# Altium footprint library FootprintsOld.PcbLib: 93 footprints (part 3 of 6)
Each footprint in its own frame and in the unit in brackets; x right, y up, seen from the top. Pads: shape width x height; smd on the part's side, far side on the other; paste and mask are expansions set on the pad; w line width, h text height; cw(c..) or ccw(c..) is an arc to the next point about the centre after c.
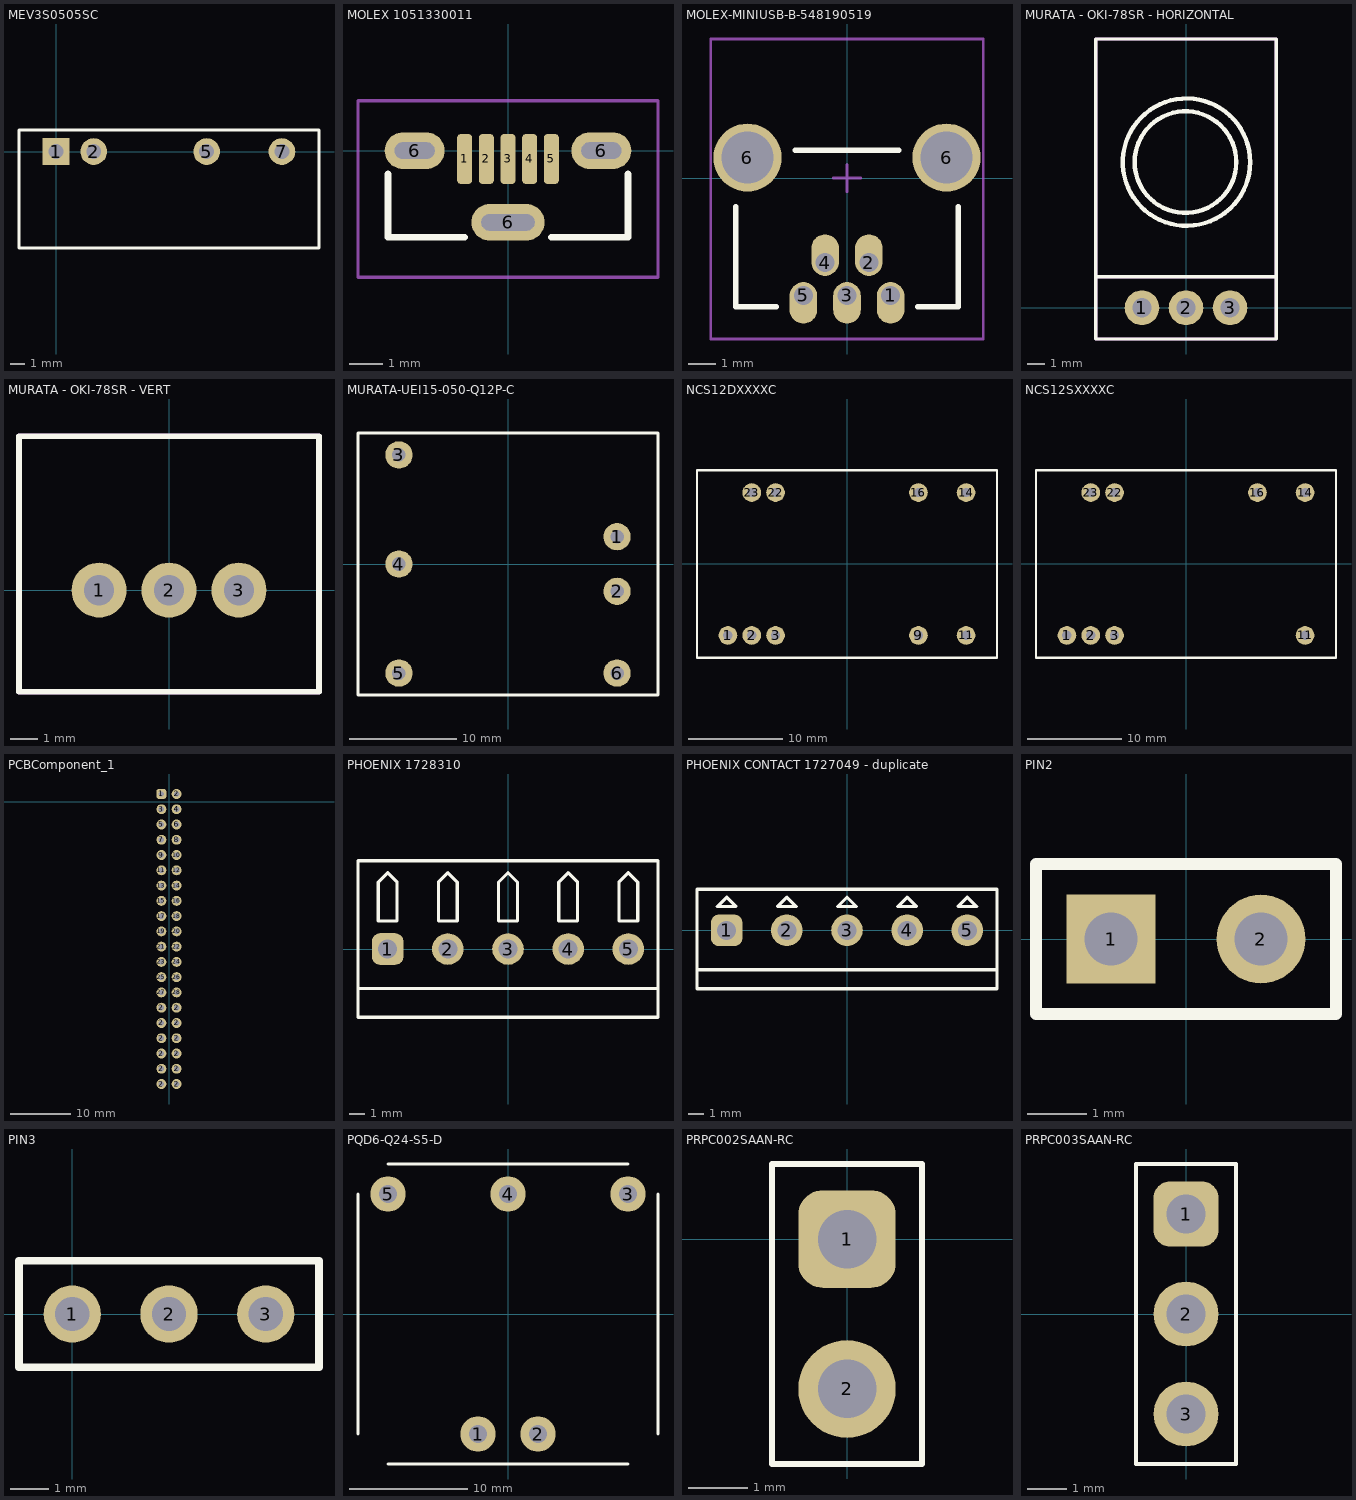
[diagram p2: the footprints below, top view; thin cyan lines are the x and y axes]

## MEV3S0505SC [mm]
pads (4):
  rect 1.8x1.8 hole 1: 1(0,0)
  round 1.8 hole 1: 2(2.54,0) 5(10.16,0) 7(15.24,0)
Top Overlay:
  lines w0.2: -2.5,-6.5 17.74,-6.5 17.74,1.45 -2.5,1.45 -2.5,-6.5
3D body "mps_dcdc_mev1s_48vin_sc_a.step": height 10.01, standoff -4.09, extent -2.105,-6.301 17.395,1.219

## MOLEX 1051330011 [mm] "Micro USB Type B Vertical"
pads (8):
  rrect50% 0.45x1.5 smd: 1(-1.3,-0.25) 2(-0.65,-0.25) 3(0,-0.25) 4(0.65,-0.25) 5(1.3,-0.25)
  oval 1.8x1.1 hole 0.5 slot 1.2 at 0 deg: 6(-2.8,0) 6(2.8,0)
  oval 2.2x1.1 hole 0.5 slot 1.6 at 0 deg: 6(0,-2.15)
Top Overlay:
  lines w0.2: -3.6,-0.7 -3.6,-2.6 -1.3,-2.6 ; 1.3,-2.6 3.6,-2.6 3.6,-0.7
Top Courtyard:
  lines w0.1: -4.5,-3.8 -4.5,1.5 4.5,1.5 4.5,-3.8 -4.5,-3.8
3D body "10513300111.STEP": height 7.52, standoff -2.28, extent -4.025,-3.325 4,1.125

## MOLEX-MINIUSB-B-548190519 [mm] "Conector Mini USB Type B Through Hole"
pads (7):
  oval 1.016x1.524 hole 0.7 copper offset 0,-0.275: 1(1.6,-4.3) 3(0,-4.3) 5(-1.6,-4.3)
  oval 1.016x1.524 hole 0.7 copper offset 0,0.275: 2(0.8,-3.1) 4(-0.8,-3.1)
  round 2.5 hole 1.9: 6(-3.65,0.75) 6(3.65,0.75)
Top Overlay:
  lines w0.2: -4.075,-1.05 -4.075,-4.725 -2.6,-4.725 ; -1.905,1.016 1.905,1.016 ; 2.6,-4.725 4.075,-4.725 4.075,-1.05
Top Courtyard:
  lines w0.1: -0.5,0 0.5,0 ; 0,-0.5 0,0.5 ; -5,-5.9 -5,5.1 5,5.1 5,-5.9 -5,-5.9
3D body "Conector-MOLEX-MINIUSB-B-548190519.STEP": height 3.95, standoff -1.8, extent -3.85,-4.5 3.85,4.5

## MURATA - OKI-78SR - HORIZONTAL [mm] "Non-Isolated DC-DC Converter"
height 9.3
pads (3):
  round 2 hole 1.1: 1(-2.54,0) 2(0,0) 3(2.54,0)
Top Overlay:
  circle w0.254: c-0.03,8.4 r2.93
  circle w0.254: c0.028,8.4 r3.672
  lines w0.2: -5.2,1.8 5.2,1.8 ; -5.2,-1.8 -5.2,15.5 5.2,15.5 5.2,-1.8 -5.2,-1.8
Mechanical 1:
  lines w0.2: -5.2,1.8 5.2,1.8 ; -5.2,-1.8 5.2,-1.8 5.2,15.5 -5.2,15.5 -5.2,-1.8
3D body: height 9.3, standoff 0, extent -5.2,-1.8 5.2,15.5

## MURATA - OKI-78SR - VERT [mm] "Non-Isolated DC-DC Converter"
height 9.3
pads (3):
  round 2 hole 1.1: 1(-2.54,0) 2(0,0) 3(2.54,0)
Top Overlay:
  lines w0.2: -5.45,-3.7 -5.45,5.6 5.45,5.6 5.45,-3.7 -5.45,-3.7
Mechanical 1:
  lines w0.2: -5.45,-3.7 -5.45,5.6 5.45,5.6 5.45,-3.7 -5.45,-3.7
3D body "mps_dcdc_oki_78sr_a.step": height 16.52, standoff -3.29, extent -5.107,-2.9 5.307,4.834

## MURATA-UEI15-050-Q12P-C [mm]
pads (6):
  round 2.54 hole 1.27: 1(10.16,2.54) 2(10.16,-2.54) 3(-10.16,10.16) 4(-10.16,0) 5(-10.16,-10.16) 6(10.16,-10.16)
Top Overlay:
  lines w0.254: -13.97,-12.192 13.97,-12.192 13.97,12.192 -13.97,12.192 -13.97,-12.192
3D body "MurataUei15.STEP": height 7.82, standoff -6.35, extent -13.97,-12.192 13.97,12.192

## NCS12DXXXXC [mm]
pads (9):
  round 2 hole 1: 1(-12.7,-7.62) 2(-10.16,-7.62) 3(-7.62,-7.62) 9(7.62,-7.62) 11(12.7,-7.62) 14(12.7,7.62) 16(7.62,7.62) 22(-7.62,7.62) 23(-10.16,7.62)
Top Overlay:
  lines w0.254: -16,-10 16,-10 16,10 -16,10 -16,-10
3D body "PowerDual.STEP": height 10.6, standoff -2.5, extent -16,-10 16,10

## NCS12SXXXXC [mm]
pads (8):
  round 2 hole 1: 1(-12.7,-7.62) 2(-10.16,-7.62) 3(-7.62,-7.62) 11(12.7,-7.62) 14(12.7,7.62) 16(7.62,7.62) 22(-7.62,7.62) 23(-10.16,7.62)
Top Overlay:
  lines w0.254: -16,-10 -16,10 16,10 16,-10 -16,-10
3D body "Power.STEP": height 10.6, standoff -2.5, extent -16,-10 16,10

## PCBComponent_1 [mil]
pads (40):
  rrect50% 65x65 hole 35: 1(-50,50)
  round 65 hole 35: 2(-50,-1850) 2(-50,-1750) 2(-50,-1650) 2(-50,-1550) 2(-50,-1450) 2(-50,-1350) 2(50,-1850) 2(50,-1750) 2(50,-1650) 2(50,-1550) 2(50,-1450) 2(50,-1350) 2(50,50) 3(-50,-50) 4(50,-50) 5(-50,-150) 6(50,-150) 7(-50,-250) 8(50,-250) 9(-50,-350) 10(50,-350) 11(-50,-450) 12(50,-450) 13(-50,-550) 14(50,-550) 15(-50,-650) 16(50,-650) 17(-50,-750) 18(50,-750) 19(-50,-850) 20(50,-850) 21(-50,-950) 22(50,-950) 23(-50,-1050) 24(50,-1050) 25(-50,-1150) 26(50,-1150) 27(-50,-1250) 28(50,-1250)

## PHOENIX 1728310 [mm] "TERM BLOCK 5POS 55DEG 3.81MM PCB"
pads (5):
  rrect50% 2x2 hole 1.2: 1(-7.62,0)
  round 2 hole 1.2: 2(-3.81,0) 3(0,0) 4(3.81,0) 5(7.62,0)
Top Overlay:
  lines w0.2: -9.5,-2.5 9.5,-2.5 ; -8.22,4.226 -7.62,4.826 -7.02,4.226 ; -8.22,4.248 -8.22,1.778 -7.02,1.778 -7.02,4.248 ; -4.41,4.226 -3.81,4.826 -3.21,4.226 ; -4.41,4.248 -4.41,1.778 -3.21,1.778 -3.21,4.248 ; -0.6,4.226 0,4.826 0.6,4.226 ; -0.6,4.248 -0.6,1.778 0.6,1.778 0.6,4.248 ; 3.21,4.226 3.81,4.826 4.41,4.226 ; 3.21,4.248 3.21,1.778 4.41,1.778 4.41,4.248 ; 7.02,4.226 7.62,4.826 8.22,4.226 ; 7.02,4.248 7.02,1.778 8.22,1.778 8.22,4.248 ; -9.5,-4.318 -9.5,5.588 9.5,5.588 9.5,-4.318 -9.5,-4.318
Top Assembly (Mech13):
  lines w0.1: -9.5,-4.318 -9.5,5.588 9.5,5.588 9.5,-4.318 -9.5,-4.318
Top Courtyard:
  lines w0.1: -0.5,0 0.5,0 ; 0,-0.5 0,0.5 ; -9.5,-4.318 9.5,-4.318 9.5,5.588 -9.5,5.588 -9.5,-4.318
3D body "pxc_1728310_05_SMKDS-1-5-3-81_3D.STEP": height 9.6, standoff -3.4, extent -9.525,-4.318 9.525,5.682

## PHOENIX CONTACT 1727049 - duplicate [mm] "TERM BLK 5P SIDE ENT 3.81MM PCB"
pads (5):
  rrect50% 2x2 hole 1.2: 1(-7.62,0)
  round 2 hole 1.2: 2(-3.81,0) 3(0,0) 4(3.81,0) 5(7.62,0)
Top Overlay:
  lines w0.2: -9.5,-2.5 9.5,-2.5 ; -7.62,2.1 -7.62,2.1 ; -7.62,2.1 -8.22,1.5 -7.02,1.5 -7.62,2.1 ; -7.62,2.1 -7.62,2.1 ; -3.81,2.1 -3.21,1.5 -4.41,1.5 -3.81,2.1 ; -3.81,2.1 -3.81,2.1 ; -3.81,2.1 -3.81,2.1 ; 0,2.1 0.6,1.5 -0.6,1.5 0,2.1 ; 0,2.1 0,2.1 ; 0,2.1 0,2.1 ; 3.81,2.1 4.41,1.5 3.21,1.5 3.81,2.1 ; 3.81,2.1 3.81,2.1 ; 3.81,2.1 3.81,2.1 ; 7.62,2.1 8.22,1.5 7.02,1.5 7.62,2.1 ; 7.62,2.1 7.62,2.1 ; 7.62,2.1 7.62,2.1 ; -9.5,-3.7 9.5,-3.7 9.5,2.6 -9.5,2.6 -9.5,-3.7
Top Assembly (Mech13):
  lines w0.1: -9.5,-3.7 9.5,-3.7 9.5,2.6 -9.5,2.6 -9.5,-3.7
Top Courtyard:
  lines w0.1: -0.5,0 0.5,0 ; 0,-0.5 0,0.5 ; -9.5,-3.7 -9.5,2.6 9.5,2.6 9.5,-3.7 -9.5,-3.7
3D body "pxc_1727049_02_MKDS-1-5-3-81_3D.stp": height 8.6, standoff -3.4, extent -9.525,-3.7 9.525,3.6

## PIN2 [mm] "Radial Cap, Thru-Hole; 2 Leads; 0.1 in Pin Spacing"
pads (2):
  rect 1.5x1.5 hole 0.9: 1(-1.27,0)
  round 1.5 hole 0.9: 2(1.27,0)
Top Overlay:
  lines w0.2: -2.54,-1.27 2.54,-1.27 2.54,1.27 -2.54,1.27 -2.54,-1.27
3D body "022284020.stp": height 8.38, standoff -3.17, extent -2.476,-1.308 2.604,1.181

## PIN3 [mm]
pads (3):
  round 1.5 hole 0.9: 1(0,0) 3(5.08,0)
  oval 1.51x1.5 hole 0.9: 2(2.54,0)
Top Overlay:
  lines w0.2: -1.4,-1.4 -1.4,1.4 6.48,1.4 6.48,-1.4 -1.4,-1.4
3D body "User Library-PinHeaderX3.STEP": height 8.51, standoff -3.68, extent -1.206,-1.46 6.413,1.46

## PQD6-Q24-S5-D [mm] "DC/DC CONVERTER 5V 1.2A 6W"
pads (5):
  round 3 hole 1.5: 1(-2.54,-10.16) 2(2.54,-10.16) 3(10.16,10.16) 4(0,10.16) 5(-10.16,10.16)
Top Overlay:
  lines w0.254: -12.7,-10.16 -12.7,0 -12.7,10.16 ; -10.16,-12.7 0,-12.7 10.16,-12.7 ; -10.16,12.7 10.16,12.7 ; 12.7,-10.16 12.7,0 12.7,10.16
3D body "PQD6-Q24-S5-D.STEP": height 11.71, standoff -4.1, extent -12.7,-12.7 12.7,12.7

## PRPC002SAAN-RC [mil]
pads (2):
  rrect50% 65x65 hole 39: 1(0,0)
  round 65 hole 39: 2(0,-100)
Top Overlay:
  lines w3.94: -50,-150 -50,50 50,50 50,-150 -50,-150

## PRPC003SAAN-RC [mil]
pads (3):
  rrect50% 65x65 hole 39: 1(0,100)
  round 65 hole 39: 2(0,0) 3(0,-100)
Top Overlay:
  lines w3.94: -50,-150 50,-150 50,150 -50,150 -50,-150
3D body "mill-max-350-10-103-00-006000.STEP": height 252, standoff -142, extent -50,-150 50,150